# Altium footprint library xhayqua.PcbLib: 185 footprints (part 9 of 12)
Each footprint in its own frame and in the unit in brackets; x right, y up, seen from the top. Pads: shape width x height; smd on the part's side, far side on the other; paste and mask are expansions set on the pad; w line width, h text height; cw(c..) or ccw(c..) is an arc to the next point about the centre after c.
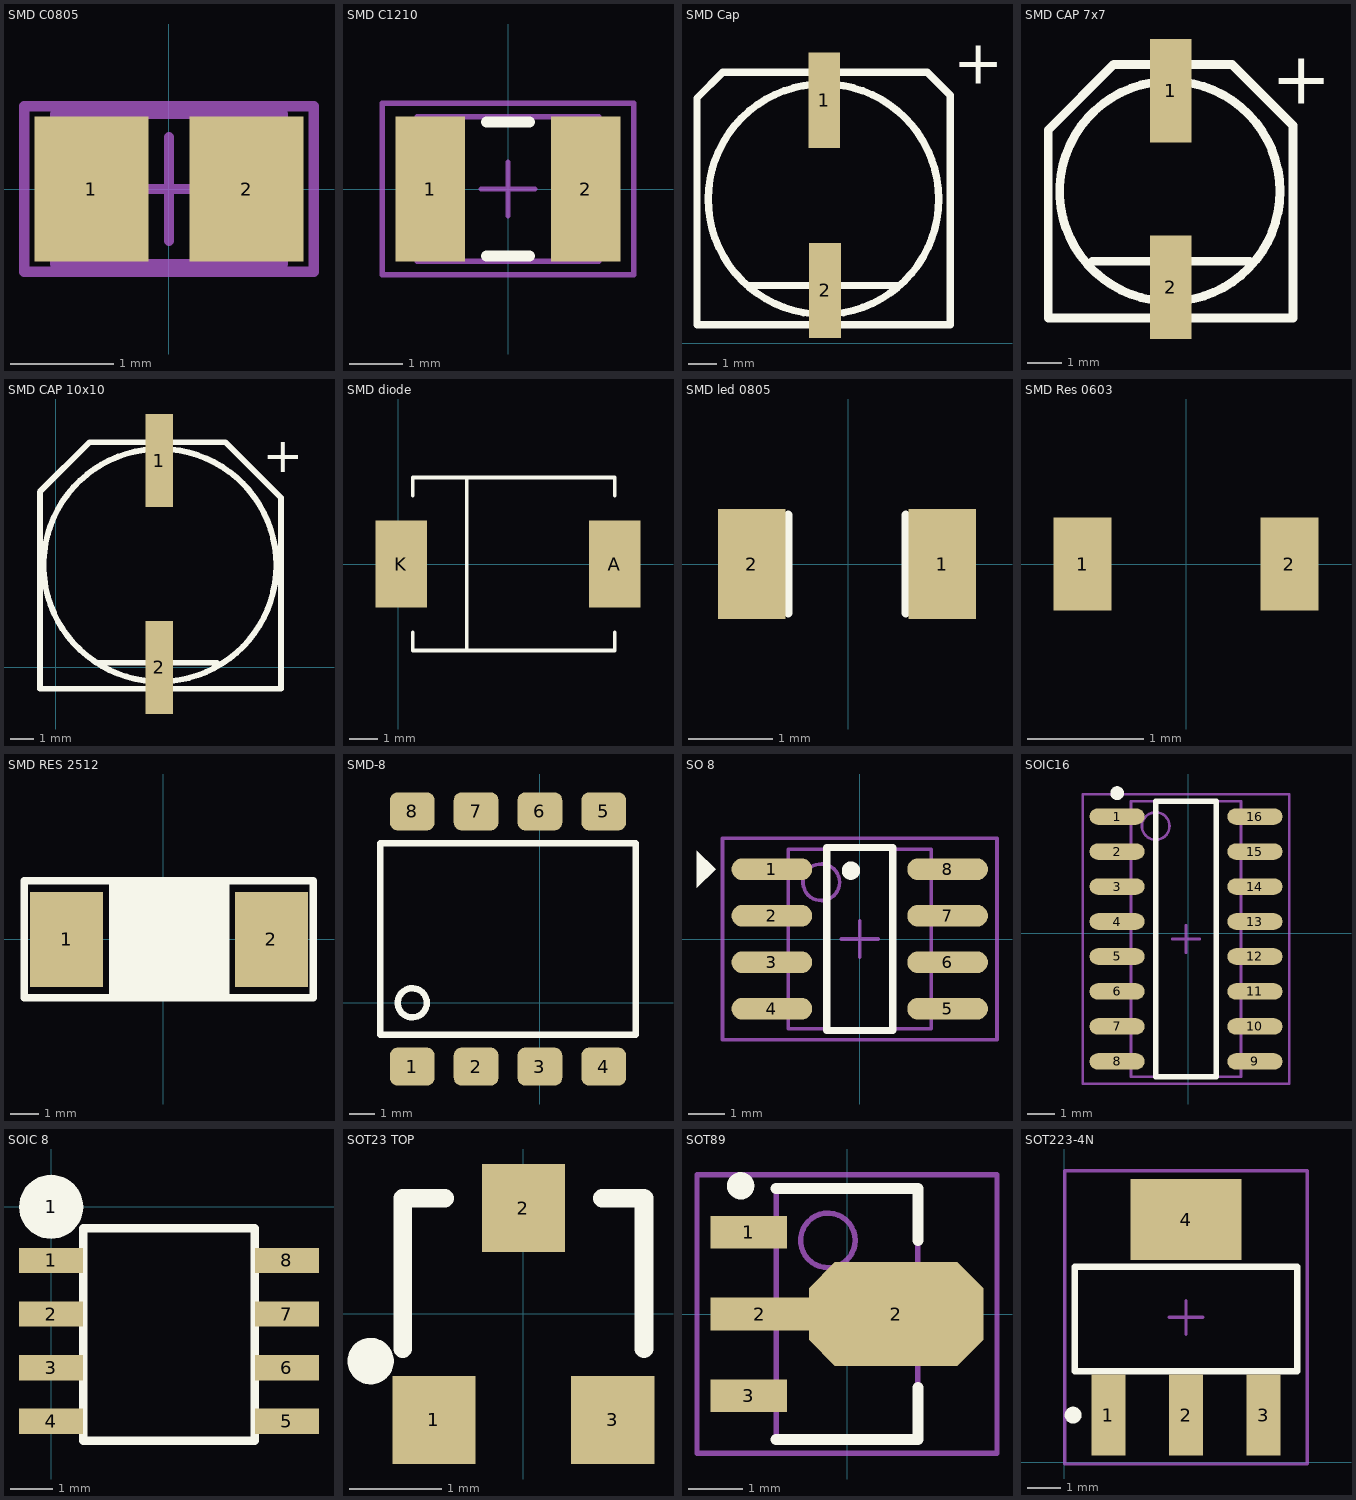
[diagram p8: the footprints below, top view; thin cyan lines are the x and y axes]

## SMD C0805 [mm]
height 2
pads (2):
  rect 1.1x1.4 smd: 1(-0.75,0) 2(0.75,0)
Mechanical 13:
  lines w0.1: -1.1,-0.725 -1.1,0.725 1.1,0.725 1.1,-0.725 -1.1,-0.725
Mechanical 15:
  lines w0.1: -0.5,0 0.5,0 ; 0,-0.5 0,0.5 ; -1.4,-0.8 -1.4,0.8 1.4,0.8 1.4,-0.8 -1.4,-0.8
3D body: height 1.4, standoff 0, extent -1.1,-0.725 1.1,0.725

## SMD C1210 [mm]
height 3
pads (2):
  rect 1.3x2.7 smd: 1(-1.45,0) 2(1.45,0)
Top Overlay:
  lines w0.2: -0.4,-1.25 0.4,-1.25 ; -0.4,1.25 0.4,1.25
Mechanical 13:
  lines w0.1: -1.7,-1.35 -1.7,1.35 1.7,1.35 1.7,-1.35 -1.7,-1.35
Mechanical 15:
  lines w0.1: -0.5,0 0.5,0 ; 0,-0.5 0,0.5 ; -2.35,-1.6 -2.35,1.6 2.35,1.6 2.35,-1.6 -2.35,-1.6
3D body: height 1.5, standoff 0, extent -1.7,-1.35 1.7,1.35

## SMD Cap [mm] "8.3x8.3x10.3mm 470uF 16V"
height 0.254
pads (2):
  rect 1.1x3.3 smd: 1(5.029,8.433) 2(5.055,1.829)
Top Overlay:
  circle w0.254: c5,5 r4
  lines w0.254: 2.4,2 7.6,2 ; 0.61,0.635 9.398,0.635 9.398,8.602 8.6,9.4 1.5,9.4 0.61,8.51 0.61,0.635
  text "+" at 9.5,9 h1.52

## SMD CAP 7x7 [mm] "35V 100uF"
pads (2):
  rect 1.2x3 smd: 1(5.08,8.001) 2(5.08,2.286)
Top Overlay:
  lines w0.254: 2.801,3.048 7.366,3.048 ; 8.255,5.077 cw(c5.055,5.077) 8.255,5.08 ; 1.524,1.397 8.636,1.397 8.636,6.985 6.858,8.763 3.429,8.763 1.524,6.858 1.524,3.505 1.524,1.397
  text "+" at 8.001,7.62 h1.52

## SMD CAP 10x10 [mm]
pads (2):
  rect 1.2x4 smd: 1(4.445,8.89) 2(4.445,0)
Top Overlay:
  lines w0.254: 1.734,0.203 6.934,0.203 ; 9.474,4.394 cw(c4.474,4.394) 9.474,4.398 ; -0.686,-0.914 9.677,-0.914 9.677,7.29 7.29,9.677 1.448,9.677 -0.686,7.544 -0.686,5.461 -0.686,1.295 -0.686,-0.914
  text "+" at 8.89,8.39 h1.52

## SMD diode [mm] "SS54 SS34"
pads (2):
  rect 1.8x3.048 smd: A(7.62,0) K(0.1,0)
Top Overlay:
  lines w0.127: 0.508,-2.413 0.508,-3.048 7.62,-3.048 7.62,-2.413 ; 0.508,2.413 0.508,3.048 7.62,3.048 7.62,2.413 ; 2.413,-3.048 2.413,3.048
Mechanical 1:
  lines w0.025: 0.508,-3.048 7.62,-3.048 ; 0.508,3.048 7.62,3.048
3D body "User Library-DIOM8261X24.STEP": height 2.4, standoff 0.03, extent -0.076,-3.048 8.054,3.052

## SMD led 0805 [mm]
pads (2):
  rect 0.8x1.3 smd: 1(1.118,0) 2(-1.143,0)
Top Overlay:
  lines w0.1: -0.711,-0.584 -0.711,0.584 ; 0.686,-0.584 0.686,0.584
3D body "led_0805.step": height 1.1, standoff 0, extent -1.01,-0.625 1.01,0.625

## SMD Res 0603 [mm]
pads (2):
  rect 0.5x0.8 smd: 1(-0.889,0) 2(0.889,0)
3D body "Res 0603.step": height 0.45, standoff 0, extent -0.8,-0.41 0.8,0.41

## SMD RES 2512 [mil]
pads (2):
  rect 100x130 smd: 1(-132,0) 2(148,0)
Top Overlay:
  rectangle: -74,-79 91,81
  lines w10: -190,-80 205,-80 205,80 -190,80 -190,-80
3D body "User Library-2512 SMD Resistor.step": height 63.07, standoff 0, extent -115.99,-59.05 134,59.06

## SMD-8 [mm] "6N137"
pads (8):
  rrect40% 1.78x1.52 smd: 1(-5.08,-2.54) 2(-2.54,-2.54) 3(0,-2.54) 4(2.54,-2.54) 5(2.54,7.62) 6(0,7.62) 7(-2.54,7.62) 8(-5.08,7.62)
Top Overlay:
  circle w0.254: c-5.08,0 r0.579
  lines w0.254: -6.35,-1.27 3.81,-1.27 3.81,6.35 -6.35,6.35 -6.35,-1.27
3D body "User Library-pdip8-smd.step": height 5.09, standoff 0.01, extent -6.225,-2.61 3.685,7.69

## SO 8 [mm]
pads (8):
  oval 2.2x0.6 smd: 1(-2.4,1.905) 2(-2.4,0.635) 3(-2.4,-0.635) 4(-2.4,-1.905) 5(2.4,-1.905) 6(2.4,-0.635) 7(2.4,0.635) 8(2.4,1.905)
Top Overlay:
  circle w0.25: c-0.241,1.866 r0.125
  region: -4.445,1.397 -3.937,1.905 -4.445,2.413
  lines w0.2: -0.9,-2.5 0.9,-2.5 0.9,2.5 -0.9,2.5 -0.9,-2.5
Mechanical 13:
  circle w0.1: c-1.05,1.55 r0.5
  lines w0.1: -1.95,-2.45 1.95,-2.45 1.95,2.45 -1.95,2.45 -1.95,-2.45
Mechanical 15:
  lines w0.1: -0.5,0 0.5,0 ; 0,-0.5 0,0.5 ; -3.75,-2.75 3.75,-2.75 3.75,2.75 -3.75,2.75 -3.75,-2.75
3D body: height 1.75, standoff 0, extent -1.95,-2.45 1.95,2.45

## SOIC16 [mm]
height 3
pads (16):
  oval 2x0.6 smd: 1(-2.575,4.24) 2(-2.575,2.97) 3(-2.575,1.7) 4(-2.575,0.43) 5(-2.575,-0.84) 6(-2.575,-2.11) 7(-2.575,-3.38) 8(-2.575,-4.65) 9(2.425,-4.65) 10(2.425,-3.38) 11(2.425,-2.11) 12(2.425,-0.84) 13(2.425,0.43) 14(2.425,1.7) 15(2.425,2.97) 16(2.425,4.24)
Top Overlay:
  circle w0.25: c-2.575,5.09 r0.125
  lines w0.2: -1.175,-5.205 1.025,-5.205 1.025,4.795 -1.175,4.795 -1.175,-5.205
Mechanical 13:
  circle w0.1: c-1.175,3.895 r0.5
  lines w0.1: -2.075,-5.205 1.925,-5.205 1.925,4.795 -2.075,4.795 -2.075,-5.205
Mechanical 15:
  lines w0.1: -0.575,-0.205 0.425,-0.205 ; -0.075,-0.705 -0.075,0.295 ; -3.825,-5.455 3.675,-5.455 3.675,5.045 -3.825,5.045 -3.825,-5.455
3D body: height 1.73, standoff 0, extent -2.075,-5.205 1.925,4.795

## SOIC 8 [mm]
pads (9):
  rect 1.52x0.6 smd: 1(0,-1.27) 2(0,-2.54) 3(0,-3.81) 4(0,-5.08) 5(5.588,-5.08) 6(5.588,-3.81) 7(5.588,-2.54) 8(5.588,-1.27)
  round 1.524 on Top Overlay: 1(0,0)
Top Overlay:
  lines w0.2: 0.762,-5.548 0.762,-0.508 4.826,-0.508 4.826,-5.548 0.762,-5.548
3D body "SOIC-8.STEP": height 1.75, standoff 0, extent -0.306,-5.67 5.706,-0.67

## SOT23 TOP [mm]
pads (3):
  rect 0.9x0.95 smd: 1(-0.965,-1.143) 2(0,1.143) 3(0.965,-1.143)
Top Overlay:
  circle w0.25: c-1.649,-0.508 r0.125
  lines w0.2: -1.3,-0.375 -1.3,1.25 -0.85,1.25 ; 0.85,1.25 1.3,1.25 1.3,-0.375
3D body "sot23-1.step": height 1, standoff 0, extent -1.46,-1.17 1.46,1.17

## SOT89 [mm]
pads (4):
  rect 1.4x0.6 smd: 1(-1.8,1.5) 3(-1.8,-1.5)
  rect 1.8x0.6 smd: 2(-1.6,0)
  oct 3.2x1.9 smd: 2(0.9,0)
Top Overlay:
  circle w0.25: c-1.95,2.35 r0.125
  lines w0.2: -1.3,-2.3 1.3,-2.3 1.3,-1.35 ; -1.3,2.3 1.3,2.3 1.3,1.35
Mechanical 13:
  circle w0.1: c-0.35,1.35 r0.5
  lines w0.1: -1.3,-2.3 1.3,-2.3 1.3,2.3 -1.3,2.3 -1.3,-2.3
Mechanical 15:
  lines w0.1: -0.5,0 0.5,0 ; 0,-0.5 0,0.5 ; -2.75,-2.55 2.75,-2.55 2.75,2.55 -2.75,2.55 -2.75,-2.55
3D body: height 1.6, standoff 0, extent -1.3,-2.3 1.3,2.3

## SOT223-4N [mm]
pads (4):
  rect 1x2.4 smd: 1(1.307,1.393) 2(3.607,1.393) 3(5.907,1.393)
  rect 3.3x2.4 smd: 4(3.607,7.193)
Top Overlay:
  circle w0.25: c0.257,1.393 r0.125
  lines w0.2: 0.305,2.692 6.909,2.692 6.909,5.791 0.305,5.791 0.305,2.692
Mechanical 15:
  lines w0.1: 3.107,4.293 4.107,4.293 ; 3.607,3.793 3.607,4.793 ; 0.007,-0.057 7.207,-0.057 7.207,8.643 0.007,8.643 0.007,-0.057
3D body "User Library-AMS1117.step": height 1.87, standoff 0.01, extent 0.356,0.595 6.856,7.595